# Altium footprint library CONNECTOR.PcbLib: 169 footprints (part 9 of 11)
Each footprint in its own frame and in the unit in brackets; x right, y up, seen from the top. Pads: shape width x height; smd on the part's side, far side on the other; paste and mask are expansions set on the pad; w line width, h text height; cw(c..) or ccw(c..) is an arc to the next point about the centre after c.
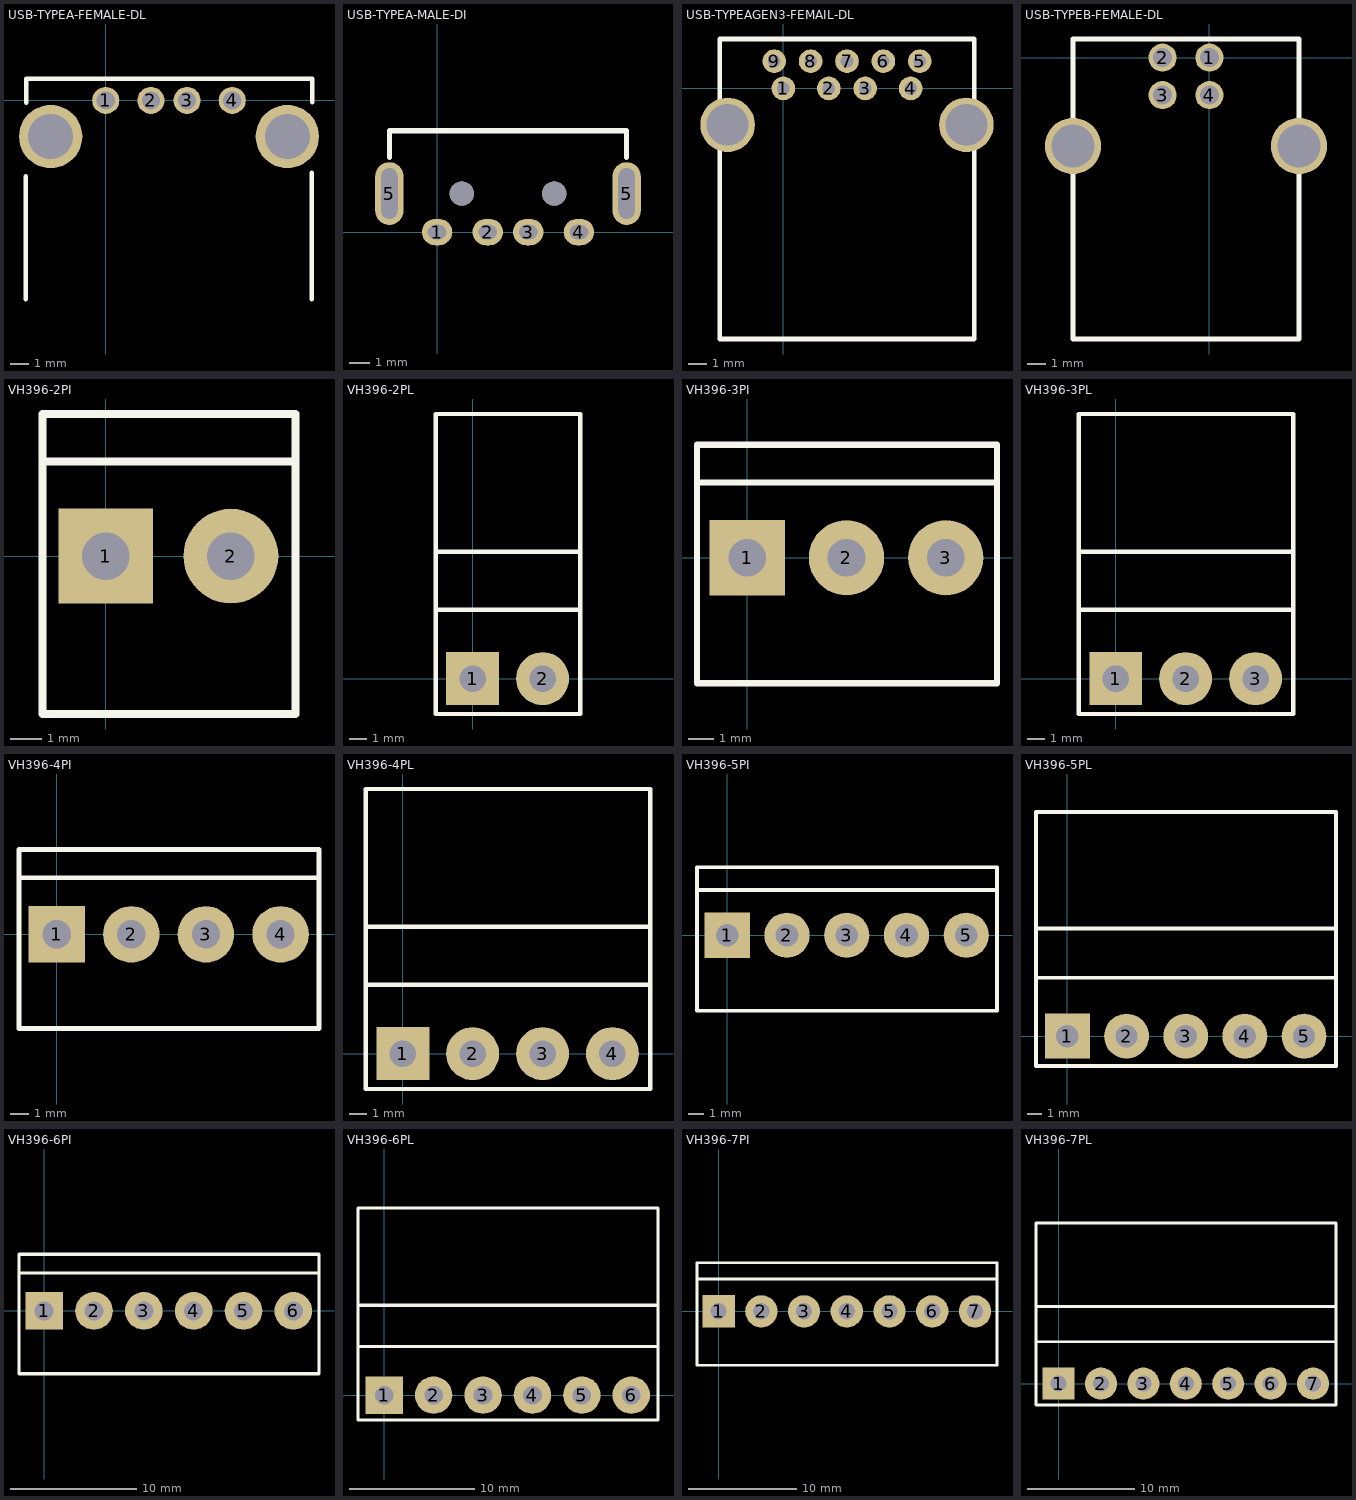
[diagram p8: the footprints below, top view; thin cyan lines are the x and y axes]

## USB-TYPEA-FEMALE-DL [mm]
pads (6):
  round 1.5 hole 1: 1(0,0) 2(2.5,0) 3(4.5,0) 4(7,0)
  round 3.5 hole 2.5: ""(-3.05,-2) ""(10.05,-2)
Top Overlay:
  lines w0.254: -4.417,-11 -4.417,-4.2 ; -4.4,-0.12 -4.4,1.2 11.42,1.2 11.42,-0.1 ; 11.403,-11 11.403,-4
3D body "SW3dPS-USB-A-01.STEP": height 6.95, standoff -4.2, extent -4.4,-12.53 11.4,1.17

## USB-TYPEA-MALE-DI [mm]
pads (8):
  oval 1.5x1.3 hole 0.7 slot 0.9 at 0 deg: 1(0,0) 2(2.5,0) 3(4.5,0) 4(7,0)
  oval 1.4x3.1 hole 0.8 slot 2.5 at 90 deg: 5(-2.35,1.9) 5(9.35,1.9)
  round 1.2 hole 1.2: ""(1.225,1.9) ""(5.775,1.9)
Top Overlay:
  lines w0.25: -2.35,3.675 -2.35,5 9.35,5 9.35,3.675

## USB-TYPEAGEN3-FEMAIL-DL [mm]
pads (11):
  round 1.3 hole 0.7: 1(0,0) 2(2.5,0) 3(4.5,0) 4(7,0) 5(7.5,1.5) 6(5.5,1.5) 7(3.5,1.5) 8(1.5,1.5) 9(-0.5,1.5)
  round 3 hole 2.3: ""(-3.07,-2) ""(10.07,-2)
Top Overlay:
  lines w0.254: -3.5,-13.78 -3.5,2.72 10.5,2.72 10.5,-13.78 -3.5,-13.78

## USB-TYPEB-FEMALE-DL [mm]
pads (6):
  round 1.5 hole 1: 1(0,0) 2(-2.5,0) 3(-2.5,-2) 4(0,-2)
  round 3 hole 2.3: ""(-7.27,-4.71) ""(4.77,-4.71)
Top Overlay:
  lines w0.254: -7.27,0.99 -7.27,-4.71 -7.27,-14.99 4.77,-14.99 4.77,-4.71 4.77,0.99 -7.24,0.99
3D body "User Library-JST_UBB-4R-D14T-4D.STEP": height 11.5, standoff -3.22, extent -8.86,-15.04 6.039,1.26

## VH396-2PI [mm]
height 11
pads (2):
  rect 3x3 hole 1.5: 1(0,0)
  round 3 hole 1.5: 2(3.96,0)
Top Overlay:
  lines w0.25: -2,3 6,3 ; -2,-5 6,-5 6,2.8 6,4.5 -2,4.5 -2,2.8 -2,-5
3D body "VH3.96-2P.STEP": height 11.2, standoff -3.5, extent -1.882,-5.038 5.918,4.047

## VH396-2PL [mm]
pads (2):
  rect 3x3 hole 1.5: 1(0,0)
  round 3 hole 1.5: 2(3.96,0)
Top Overlay:
  lines w0.25: -2.1,3.9 6.1,3.9 ; -2.1,7.2 6.1,7.2 ; -2.1,-2 6.1,-2 6.1,15 -2.1,15 -2.1,-2

## VH396-3PI [mm]
height 11
pads (3):
  rect 3x3 hole 1.5: 1(0,0)
  round 3 hole 1.5: 2(3.96,0) 3(7.92,0)
Top Overlay:
  lines w0.25: -2,3 -2,4.5 9.96,4.5 9.96,3 ; -2,3 -2,-5 9.96,-5 9.96,3 ; -2,3 9.96,3
3D body "VH3.96-2P.STEP": height 11.2, standoff -3.5, extent -1.882,-5.038 5.918,4.047

## VH396-3PL [mm]
pads (3):
  rect 3x3 hole 1.5: 1(0,0)
  round 3 hole 1.5: 2(3.96,0) 3(7.92,0)
Top Overlay:
  lines w0.25: -2.1,3.9 10.06,3.9 ; -2.1,7.2 10.06,7.2 ; 10.06,3.9 10.06,7.2 ; 10.06,3.9 10.06,-2 -2.1,-2 -2.1,15 10.06,15 10.06,7.2

## VH396-4PI [mm]
height 11
pads (4):
  rect 3x3 hole 1.5: 1(0,0)
  round 3 hole 1.5: 2(3.96,0) 3(7.92,0) 4(11.88,0)
Top Overlay:
  lines w0.25: -2,3 13.92,3 ; -2,3 -2,-5 13.92,-5 13.92,3 ; -2,3 -2,4.5 13.92,4.5 13.92,3
3D body "VH3.96-2P.STEP": height 11.2, standoff -3.5, extent -1.882,-5.038 5.918,4.047

## VH396-4PL [mm]
pads (4):
  rect 3x3 hole 1.5: 1(0,0)
  round 3 hole 1.5: 2(3.96,0) 3(7.92,0) 4(11.88,0)
Top Overlay:
  lines w0.25: -2.1,3.9 14.02,3.9 ; -2.1,7.2 14.02,7.2 ; 14.02,3.9 14.02,-2 -2.1,-2 -2.1,15 14.02,15 14.02,7.2 ; 14.02,3.9 14.02,7.2

## VH396-5PI [mm]
height 11
pads (5):
  rect 3x3 hole 1.5: 1(0,0)
  round 3 hole 1.5: 2(3.96,0) 3(7.92,0) 4(11.88,0) 5(15.84,0)
Top Overlay:
  lines w0.25: -2,3 -2,4.5 17.88,4.5 17.88,3 ; -2,3 -2,-5 17.88,-5 17.88,3 ; -2,3 17.88,3
3D body "VH3.96-2P.STEP": height 11.2, standoff -3.5, extent -1.882,-5.038 5.918,4.047

## VH396-5PL [mm]
pads (5):
  rect 3x3 hole 1.5: 1(0,0)
  round 3 hole 1.5: 2(3.96,0) 3(7.92,0) 4(11.88,0) 5(15.84,0)
Top Overlay:
  lines w0.25: -2.1,3.9 17.98,3.9 ; -2.1,7.2 17.98,7.2 ; 17.98,3.9 17.98,-2 -2.1,-2 -2.1,15 17.98,15 17.98,7.2 ; 17.98,3.9 17.98,7.2

## VH396-6PI [mm]
height 11
pads (6):
  rect 3x3 hole 1.5: 1(0,0)
  round 3 hole 1.5: 2(3.96,0) 3(7.92,0) 4(11.88,0) 5(15.84,0) 6(19.8,0)
Top Overlay:
  lines w0.25: -2,3 21.84,3 ; -2,3 -2,-5 21.84,-5 21.84,3 ; -2,3 -2,4.5 21.84,4.5 21.84,3
3D body "VH3.96-2P.STEP": height 11.2, standoff -3.5, extent -1.882,-5.038 5.918,4.047

## VH396-6PL [mm]
pads (6):
  rect 3x3 hole 1.5: 1(0,0)
  round 3 hole 1.5: 2(3.96,0) 3(7.92,0) 4(11.88,0) 5(15.84,0) 6(19.8,0)
Top Overlay:
  lines w0.25: -2.1,3.9 21.94,3.9 ; -2.1,7.2 21.94,7.2 ; 21.94,3.9 21.94,7.2 ; 21.94,3.9 21.94,-2 -2.1,-2 -2.1,15 21.94,15 21.94,7.2

## VH396-7PI [mm]
height 11
pads (7):
  rect 3x3 hole 1.5: 1(0,0)
  round 3 hole 1.5: 2(3.96,0) 3(7.92,0) 4(11.88,0) 5(15.84,0) 6(19.8,0) 7(23.76,0)
Top Overlay:
  lines w0.25: -2,3 25.8,3 ; -2,3 -2,-5 25.8,-5 25.8,3 ; -2,3 -2,4.5 25.8,4.5 25.8,3
3D body "VH3.96-2P.STEP": height 11.2, standoff -3.5, extent -1.882,-5.038 5.918,4.047

## VH396-7PL [mm]
pads (7):
  rect 3x3 hole 1.5: 1(0,0)
  round 3 hole 1.5: 2(3.96,0) 3(7.92,0) 4(11.88,0) 5(15.84,0) 6(19.8,0) 7(23.76,0)
Top Overlay:
  lines w0.25: -2.1,3.9 25.9,3.9 ; -2.1,7.2 25.9,7.2 ; 25.9,3.9 25.9,-2 -2.1,-2 -2.1,15 25.9,15 25.9,7.2 ; 25.9,3.9 25.9,7.2